# Altium footprint library KNR_Kurs.PcbLib: 250 footprints (part 10 of 16)
Each footprint in its own frame and in the unit in brackets; x right, y up, seen from the top. Pads: shape width x height; smd on the part's side, far side on the other; paste and mask are expansions set on the pad; w line width, h text height; cw(c..) or ccw(c..) is an arc to the next point about the centre after c.
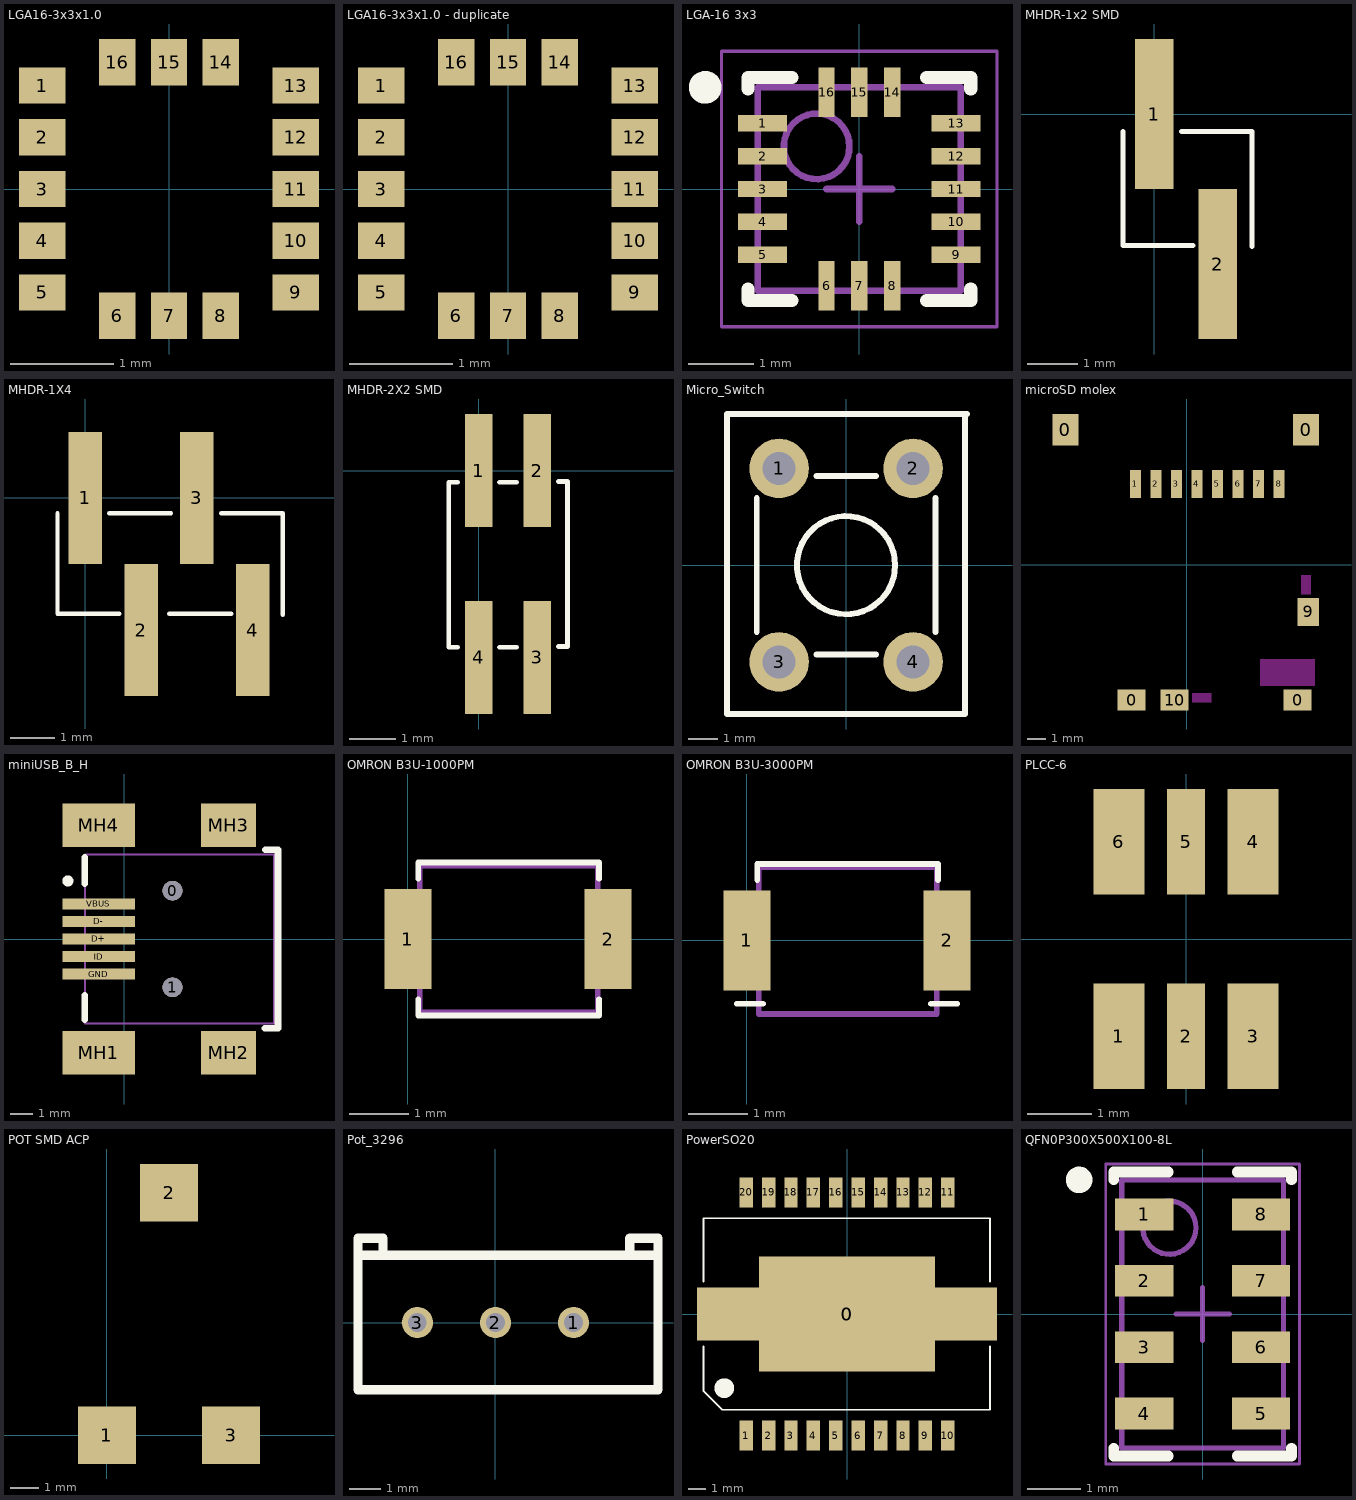
[diagram p9: the footprints below, top view; thin cyan lines are the x and y axes]

## LGA16-3x3x1.0 [mm]
height 1
pads (16):
  rect 0.45x0.35 smd mask+0.05: 1(-1.225,1) 2(-1.225,0.5) 3(-1.225,0) 4(-1.225,-0.5) 5(-1.225,-1) 9(1.225,-1) 10(1.225,-0.5) 11(1.225,0) 12(1.225,0.5) 13(1.225,1)
  rect 0.35x0.45 smd mask+0.05: 6(-0.5,-1.225) 7(0,-1.225) 8(0.5,-1.225) 14(0.5,1.225) 15(0,1.225) 16(-0.5,1.225)
3D body: height 1, standoff 0, extent -1.5,-1.5 1.5,1.5

## LGA16-3x3x1.0 - duplicate [mm]
height 1
pads (16):
  rect 0.45x0.35 smd mask+0.05: 1(-1.225,1) 2(-1.225,0.5) 3(-1.225,0) 4(-1.225,-0.5) 5(-1.225,-1) 9(1.225,-1) 10(1.225,-0.5) 11(1.225,0) 12(1.225,0.5) 13(1.225,1)
  rect 0.35x0.45 smd mask+0.05: 6(-0.5,-1.225) 7(0,-1.225) 8(0.5,-1.225) 14(0.5,1.225) 15(0,1.225) 16(-0.5,1.225)
3D body: height 1, standoff 0, extent -1.5,-1.5 1.5,1.5

## LGA-16 3x3 [mm]
height 0.8
pads (16):
  rect 0.75x0.25 smd: 1(-1.475,1) 2(-1.475,0.5) 3(-1.475,0) 4(-1.475,-0.5) 5(-1.475,-1) 9(1.475,-1) 10(1.475,-0.5) 11(1.475,0) 12(1.475,0.5) 13(1.475,1)
  rect 0.25x0.75 smd: 6(-0.5,-1.475) 7(0,-1.475) 8(0.5,-1.475) 14(0.5,1.475) 15(0,1.475) 16(-0.5,1.475)
Top Overlay:
  circle w0.25: c-2.35,1.55 r0.125
  lines w0.2: -1.7,-1.525 -1.7,-1.7 -1.025,-1.7 ; -1.7,1.525 -1.7,1.7 -1.025,1.7 ; 1.025,-1.7 1.7,-1.7 1.7,-1.525 ; 1.025,1.7 1.7,1.7 1.7,1.525
Mechanical 13:
  circle w0.1: c-0.65,0.65 r0.5
  lines w0.1: -1.55,-1.55 1.55,-1.55 1.55,1.55 -1.55,1.55 -1.55,-1.55
Mechanical 15:
  lines w0.05: -2.1,-2.1 2.1,-2.1 2.1,2.1 -2.1,2.1 -2.1,-2.1
  lines w0.1: -0.5,0 0.5,0 ; 0,-0.5 0,0.5
3D body "User Library-LIS331AL.step": height 1.01, standoff -0.01, extent -1.5,-1.5 1.5,1.5

## MHDR-1x2 SMD [mm]
pads (2):
  rect 0.76x3 smd: 1(0,0) 2(1.27,-3)
Top Overlay:
  lines w0.1: -0.625,-0.35 -0.625,-2.625 0.775,-2.625 ; 0.55,-0.35 1.95,-0.35 1.95,-2.65
3D body "MHDR-1x2.stp": height 4.5, standoff 0, extent -0.635,-3.605 1.905,0.625

## MHDR-1X4 [mm]
pads (4):
  rect 0.76x3 smd: 1(0,0) 2(1.27,-3) 3(2.54,0) 4(3.81,-3)
Top Overlay:
  lines w0.1: -0.625,-0.35 -0.625,-2.625 0.775,-2.625 ; 0.55,-0.35 1.95,-0.35 ; 1.915,-2.625 3.315,-2.625 ; 3.09,-0.35 4.49,-0.35 4.49,-2.65
3D body "MHDR-1x2.stp": height 4.5, standoff 0, extent -0.635,-3.605 1.905,0.625
3D body "MHDR-1x2.stp": height 4.5, standoff 0, extent 1.905,-3.605 4.445,0.625

## MHDR-2X2 SMD [mm]
pads (4):
  rect 0.6x2.45 smd: 1(0,0) 2(1.27,0) 3(1.27,-4.05) 4(0,-4.05)
Top Overlay:
  lines w0.1: -0.45,-3.825 -0.65,-3.825 -0.65,-0.25 -0.45,-0.25 ; 0.45,-3.825 0.825,-3.825 ; 0.45,-0.25 0.825,-0.25 ; 1.725,-3.813 1.925,-3.813 1.925,-0.238 1.725,-0.238
3D body "SMD_MHDR2x2.stp": height 4.5, standoff 0, extent -0.635,-4.775 1.905,0.725

## Micro_Switch [mm] "Micro Switch with 2 leads used"
pads (4):
  round 2 hole 1.1: 1(-2.25,3.25) 2(2.25,3.25) 3(-2.25,-3.25) 4(2.25,-3.25)
Top Overlay:
  circle w0.2: c0,0 r1.65
  lines w0.2: -4,5.08 -4,-5 4,-5 4,5.08 ; -3.936,5.08 4.064,5.08 ; -3,-2.25 -3,2.25 ; -1,-3 1,-3 ; -1,3 1,3 ; 3,-2.25 3,2.25
3D body "Micro_Switch.stp": height 4.1, standoff 0, extent -3,-3.302 3,3.098

## microSD molex [mm]
pads (14):
  rect 1.4x1.7 smd: 0(-6.512,7.238) 0(6.388,7.238)
  rect 1.5x1.15 smd: 0(-2.962,-7.237) 0(5.938,-7.237) 10(-0.662,-7.237)
  rect 0.6x1.5 smd: 1(-2.762,4.338) 2(-1.662,4.338) 3(-0.562,4.338) 4(0.538,4.338) 5(1.637,4.338) 6(2.738,4.338) 7(3.838,4.338) 8(4.938,4.338)
  rect 1.15x1.5 smd: 9(6.513,-2.512)
Top Layer keep-out:
  region: 0.288,-6.862 0.288,-7.362 1.313,-7.362 1.313,-6.862
  region: 3.938,-5.062 6.838,-5.062 6.838,-6.462 3.938,-6.462
  region: 6.138,-0.562 6.638,-0.562 6.638,-1.562 6.138,-1.562
3D body "microSDmolex.stp": height 1.8, standoff 0, extent -6.913,-7.537 6.888,7.962

## miniUSB_B_H [mm] "Connector; USB Mini-B, Sinking Type, SM; 5 Position; Right Angle"
height 0.35
pads (11):
  round 0.9 hole 0.9 unplated: 0(2.2,2.2) 1(2.2,-2.2)
  rect 3.3x0.5 smd: D+(-1.15,0) D-(-1.15,0.8) GND(-1.15,-1.6) ID(-1.15,-0.8) VBUS(-1.15,1.6)
  rect 3.3x2 smd: MH1(-1.15,-5.175) MH4(-1.15,5.175)
  rect 2.5x2 smd: MH2(4.75,-5.175) MH3(4.75,5.175)
Top Overlay:
  circle w0.25: c-2.563,2.642 r0.125
  lines w0.3: -1.788,-3.683 -1.788,-2.565 ; -1.788,2.515 -1.788,3.708 ; 6.401,-4.064 6.985,-4.064 ; 6.426,4.064 6.985,4.064 ; 7,-4.064 7,4.064
Top Solder:
  rectangle: -2.921,-1.956 0.61,1.956
Mechanical 13:
  lines w0.1: -1.788,-3.85 6.813,-3.85 6.813,3.85 -1.788,3.85 -1.788,-3.85
3D body "SW3dPS-548190572_USBBMINI.STEP": height 4, standoff -0.05, extent -1.833,-5.052 7.167,4.849

## OMRON B3U-1000PM [mm] "Tactile Switch OMRON B3U-1000PM"
height 2
pads (2):
  rect 0.8x1.7 smd: 1(0,0) 2(3.4,0)
Top Overlay:
  lines w0.1: 0.175,-1.025 0.175,-1.3 3.25,-1.3 3.25,-1.025 ; 0.175,1.025 0.175,1.3 3.25,1.3 3.25,1.025
Mechanical 1:
  lines w0.1: 0.2,-1.25 0.2,1.25 3.225,1.25 3.225,-1.25 0.2,-1.25
3D body "b3u-1000p.stp": height 1.6, standoff 0, extent -0.3,-1.25 3.7,1.25

## OMRON B3U-3000PM [mm] "Tactile  OMRON B3U-3000PM"
height 2
pads (2):
  rect 0.8x1.7 smd: 1(0,0) 2(3.4,0)
Top Overlay:
  lines w0.1: -0.175,-1.075 0.275,-1.075 ; 0.175,1.025 0.175,1.3 3.25,1.3 3.25,1.025 ; 3.125,-1.075 3.575,-1.075
Mechanical 1:
  lines w0.1: 0.2,-1.25 3.225,-1.25 3.225,1.25 0.2,1.25 0.2,-1.25
3D body "b3u-3000p.stp": height 1.2, standoff 0, extent -0.3,-1.95 3.7,1.25

## PLCC-6 [mm] "RGB LED"
pads (6):
  rect 0.8x1.65 smd: 1(-1.05,-1.525) 3(1.05,-1.525) 4(1.05,1.525) 6(-1.05,1.525)
  rect 0.6x1.65 smd: 2(0,-1.525) 5(0,1.525)
3D body "User Library-LED_RGB_Osram_LRTB_G6SG.step": height 2.01, standoff 0, extent -1.75,-1.825 1.75,1.775

## POT SMD ACP [mm]
pads (3):
  rect 2x2 smd: 1(0,0) 2(2.15,8.4) 3(4.3,0)
3D body "ACP CA6.stp": height 3.9, standoff 0, extent -1.1,-0.5 5.4,9.2

## Pot_3296 [mm] "Bochen 3296 Pin2 - Wiper"
pads (3):
  rrect100% 1x1 hole 0.6: 1(2.5,0) 2(0,0) 3(-2.5,0)
Top Overlay:
  lines w0.3: -4.4,2.1 -4.4,2.7 -3.6,2.7 -3.6,2.2 ; 4.3,2.2 4.3,2.7 5.2,2.7 5.2,2.1 ; -4.4,-2.15 5.2,-2.15 5.2,2.15 -4.4,2.15 -4.4,-2.15
3D body: height 14, standoff 3, extent 4.4,2.1 5.2,2.7
3D body: height 14, standoff 3, extent -4.4,2.1 -3.6,2.7
3D body: height 14, standoff 3, extent -4.4,-2.1 5.2,2.1
3D body: height 3, standoff 0, extent -2.8,-0.3 -2.202,0.299
3D body: height 3, standoff 0, extent -0.3,-0.3 0.298,0.299
3D body: height 3, standoff 0, extent 2.2,-0.3 2.798,0.299
3D body: height 16, standoff 10, extent 3.1,-1.9 5.092,0.096

## PowerSO20 [mm]
height 2
pads (22):
  rect 10x6.5 smd: 0(0,0)
  rect 17x3 smd: 0(0,0)
  rect 0.76x1.7 smd: 1(-5.715,-6.89) 2(-4.445,-6.89) 3(-3.175,-6.89) 4(-1.905,-6.89) 5(-0.635,-6.89) 6(0.635,-6.89) 7(1.905,-6.89) 8(3.175,-6.89) 9(4.445,-6.89) 10(5.715,-6.89) 11(5.715,6.89) 12(4.445,6.89) 13(3.175,6.89) 14(1.905,6.89) 15(0.635,6.89) 16(-0.635,6.89) 17(-1.905,6.89) 18(-3.175,6.89) 19(-4.445,6.89) 20(-5.715,6.89)
Top Overlay:
  circle w1: c-6.95,-4.2 r0.056
  lines w0.1: -8.125,-1.825 -8.125,-4.375 -7.075,-5.425 8.1,-5.425 8.1,-1.825 ; -8.125,1.825 -8.125,5.425 8.1,5.425 8.1,1.825
3D body "User Library-PowerSO20.STEP": height 3.6, standoff 0, extent -8,-7.175 8,7.225

## QFN0P300X500X100-8L [mm] "QFN, 8-Leads, Body 3,00x5,00mm, Pitch 0,00mm/1,25mm, IPC High Density"
height 1
pads (8):
  rect 1.1x0.6 smd: 1(-1.1,1.875) 2(-1.1,0.625) 3(-1.1,-0.625) 4(-1.1,-1.875) 5(1.1,-1.875) 6(1.1,-0.625) 7(1.1,0.625) 8(1.1,1.875)
Top Overlay:
  circle w0.25: c-2.325,2.525 r0.125
  lines w0.2: -1.675,-2.525 -1.675,-2.675 -0.65,-2.675 ; -1.675,2.525 -1.675,2.675 -0.65,2.675 ; 0.65,-2.675 1.675,-2.675 1.675,-2.525 ; 0.65,2.675 1.675,2.675 1.675,2.525
Mechanical 13:
  circle w0.1: c-0.625,1.625 r0.5
  lines w0.1: -1.525,-2.525 -1.525,2.525 1.525,2.525 1.525,-2.525 -1.525,-2.525
Mechanical 15:
  lines w0.05: -1.825,-2.825 -1.825,2.825 1.825,2.825 1.825,-2.825 -1.825,-2.825
  lines w0.1: -0.5,0 0.5,0 ; 0,-0.5 0,0.5
3D body "User Library-ms5611.step": height 1.06, standoff 0, extent -1.55,-2.5 1.55,2.5